# Altium footprint library Miscellaneous footprints.PcbLib: 84 footprints (part 2 of 6)
Each footprint in its own frame and in the unit in brackets; x right, y up, seen from the top. Pads: shape width x height; smd on the part's side, far side on the other; paste and mask are expansions set on the pad; w line width, h text height; cw(c..) or ccw(c..) is an arc to the next point about the centre after c.
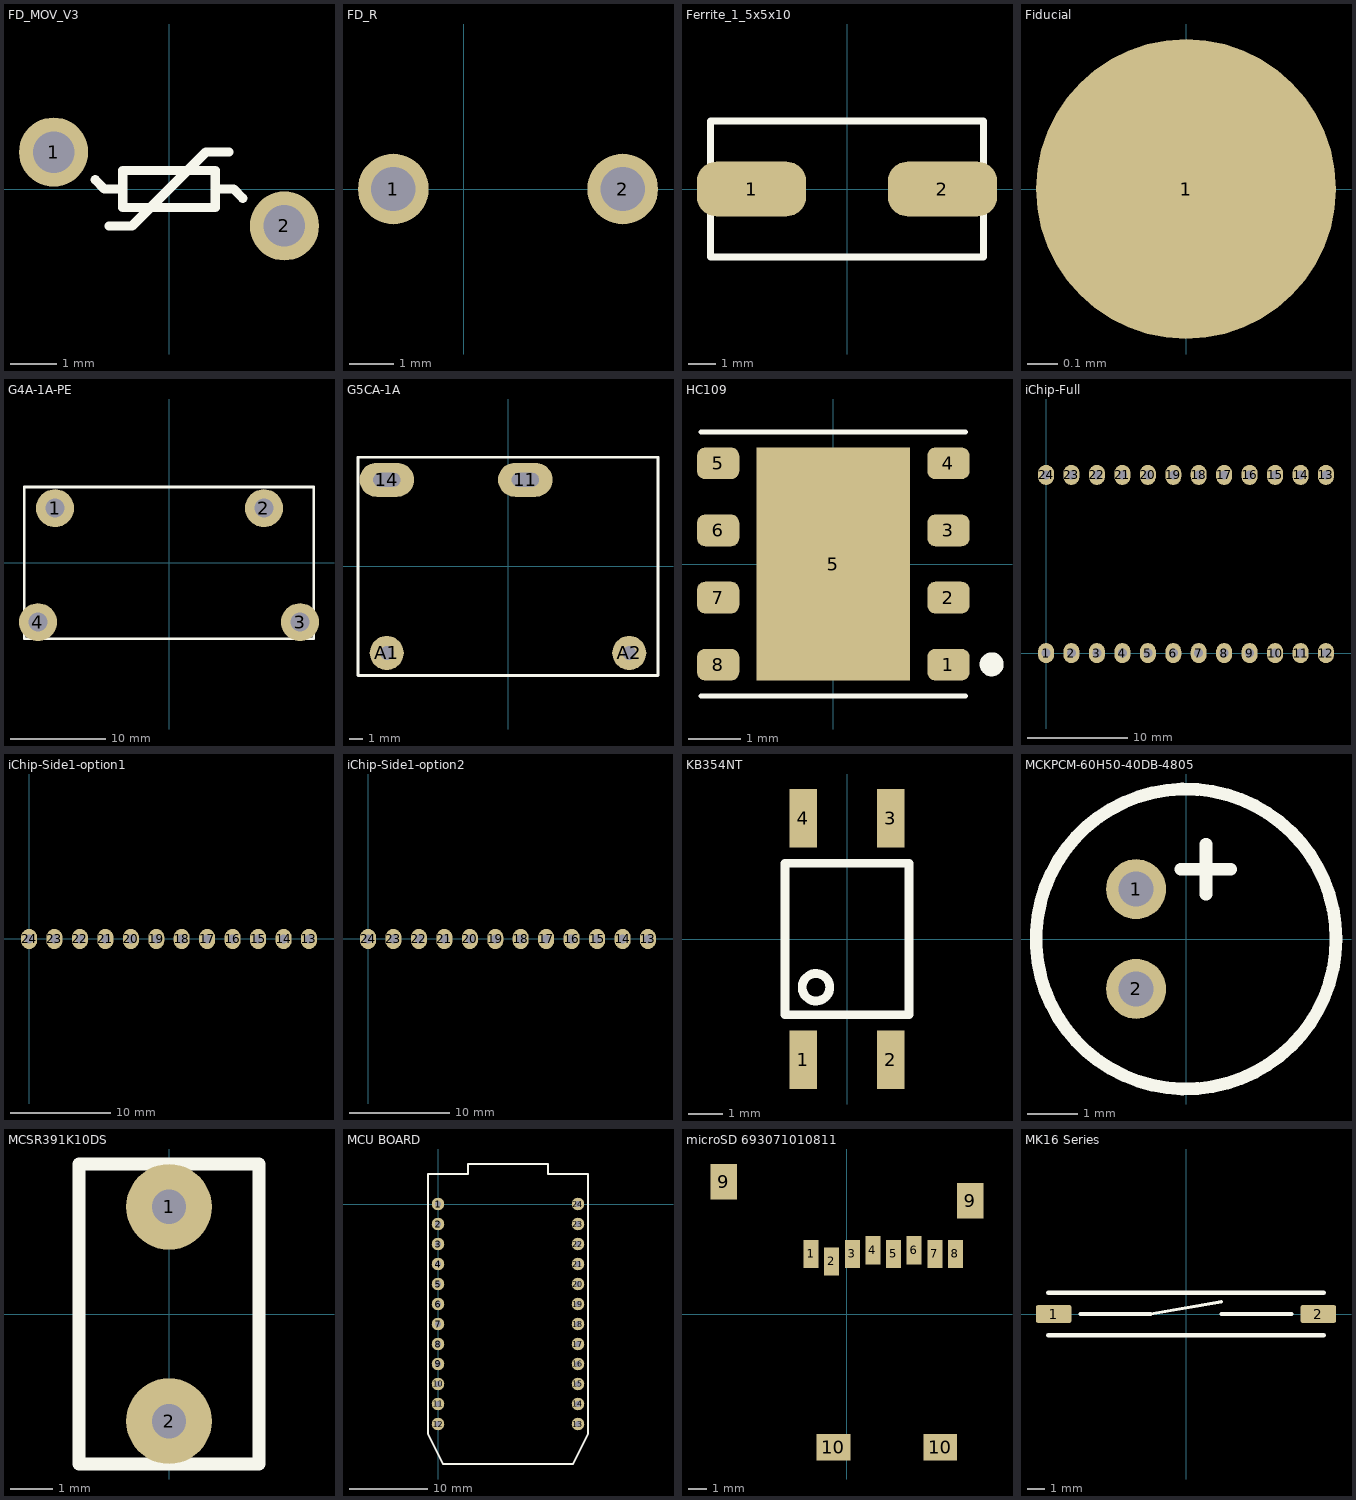
[diagram p1: the footprints below, top view; thin cyan lines are the x and y axes]

## FD_MOV_V3 [mm]
pads (2):
  round 1.5 hole 0.9: 1(-2.5,0.8) 2(2.5,-0.8)
Top Overlay:
  lines w0.2: -1.6,0.2 -1.4,0 -1,0 ; -1.3,-0.8 -0.8,-0.8 0,0 0.8,0.8 1.3,0.8 ; 1,0 1.4,0 1.6,-0.2 ; -1,0 -1,-0.4 1,-0.4 1,0.4 -1,0.4 -1,0
3D body: height 12, standoff 0, extent -4.499,-1.791 4.498,1.791

## FD_R [mm] "FD_R"
pads (2):
  round 1.6 hole 1: 1(-1.6,0) 2(3.6,0)
3D body: height 6, standoff 0, extent -3.6,-0.4 4,18.705

## Ferrite_1_5x5x10 [mm] "Ferrite_1_5x5x10"
height 5
pads (2):
  rrect70% 4x2 smd: 1(-3.5,0) 2(3.5,0)
Top Overlay:
  lines w0.254: -5,-2.5 5,-2.5 5,2.5 -5,2.5 -5,-2.5
3D body: height 5, standoff 0, extent -5,-2.5 5,2.5

## Fiducial [mm] "Fiducial, 1mm metal, 2mm solder mask"
pads (1):
  round 1 smd paste-1 mask+0.5: 1(0,0)

## G4A-1A-PE [mm] "20A relay"
pads (4):
  round 4 hole 2: 1(-12,5.75) 2(10,5.75) 3(13.8,-6.25) 4(-13.8,-6.25)
Top Overlay:
  lines w0.3: -15.25,-8 0,-8 15.25,-8 15.25,8 -15.25,8 -15.25,-8
3D body: height 26.8, standoff 0, extent -15.249,-7.999 15.249,7.999

## G5CA-1A [mm] "relay"
pads (4):
  oval 4x2.5 hole 1 slot 2 at 0 deg: 11(1.27,6.35) 14(-8.89,6.35)
  round 2.5 hole 1: A1(-8.89,-6.35) A2(8.89,-6.35)
Top Overlay:
  lines w0.2: -11,-8 0,-8 11,-8 11,0 11,8 0,8 -11,8 -11,0 -11,-8

## HC109 [mm] "HC109"
height 2
pads (9):
  rrect50% 0.8x0.6 smd: 1(2.18,-1.905) 2(2.18,-0.635) 3(2.18,0.635) 4(2.18,1.905) 5(-2.18,1.905) 6(-2.18,0.635) 7(-2.18,-0.635) 8(-2.18,-1.905)
  rect 2.9x4.41 smd: 5(0,0)
Top Overlay:
  circle w0.254: c3,-1.9 r0.1
  lines w0.1: -2.5,-2.5 2.5,-2.5 ; -2.5,2.5 2.5,2.5

## iChip-Full [mm]
pads (24):
  oval 1.6x2 hole 0.9: 1(0,0) 2(2.54,0) 3(5.08,0) 4(7.62,0) 5(10.16,0) 6(12.7,0) 7(15.24,0) 8(17.78,0) 9(20.32,0) 10(22.86,0) 11(25.4,0) 12(27.94,0) 13(27.94,17.78) 14(25.4,17.78) 15(22.86,17.78) 16(20.32,17.78) 17(17.78,17.78) 18(15.24,17.78) 19(12.7,17.78) 20(10.16,17.78) 21(7.62,17.78) 22(5.08,17.78) 23(2.54,17.78) 24(0,17.78)
3D body: height 5.28, standoff 0.95, extent -18.325,-2.1 32.925,19.9

## iChip-Side1-option1 [mm]
pads (12):
  oval 1.6x2 hole 0.9: 13(27.94,0) 14(25.4,0) 15(22.86,0) 16(20.32,0) 17(17.78,0) 18(15.24,0) 19(12.7,0) 20(10.16,0) 21(7.62,0) 22(5.08,0) 23(2.54,0) 24(0,0)
3D body: height 24.7, standoff 2.7, extent -18.35,1.54 32.9,5.86

## iChip-Side1-option2 [mm]
pads (12):
  oval 1.6x2 hole 0.9: 13(27.94,0) 14(25.4,0) 15(22.86,0) 16(20.32,0) 17(17.78,0) 18(15.24,0) 19(12.7,0) 20(10.16,0) 21(7.62,0) 22(5.08,0) 23(2.54,0) 24(0,0)
3D body: height 24.7, standoff 2.7, extent -18.35,-5.86 32.9,-1.54

## KB354NT [mm] "KB354NT"
height 2.8
pads (4):
  rect 0.8x1.7 smd: 1(-1.27,-3.5) 2(1.27,-3.5) 3(1.27,3.5) 4(-1.27,3.5)
Top Overlay:
  circle w0.254: c-0.9,-1.4 r0.4
  lines w0.254: -1.8,-2.2 1.8,-2.2 1.8,2.2 -1.8,2.2 -1.8,-2.2
3D body: height 2.62, standoff 0.02, extent -2.2,-3.5 2.2,3.5

## MCKPCM-60H50-40DB-4805 [mm] "MCKPCM-60H50-40DB-4805"
height 4.8
pads (2):
  round 1.2 hole 0.7: 1(-1,1) 2(-1,-1)
Top Overlay:
  circle w0.254: c0,0 r3.007
  lines w0.254: -0.1,1.4 0.4,1.4 0.9,1.4 ; 0.4,0.9 0.4,1.9
3D body: height 2.7, standoff -1.7, extent -3,-3 3,3

## MCSR391K10DS [mm] "MCSR391K10DS"
pads (2):
  round 2 hole 0.8: 1(0,2.5) 2(0,-2.5)
Top Overlay:
  lines w0.3: -2.1,-3.5 0,-3.5 2.1,-3.5 2.1,0 2.1,3.5 0,3.5 -2.1,3.5 -2.1,0 -2.1,-3.5
3D body: height 10, standoff 0, extent -2.099,-3.499 2.099,3.499

## MCU BOARD [mm]
pads (24):
  round 1.6 hole 0.8: 1(0,0) 2(0,-2.54) 3(0,-5.08) 4(0,-7.62) 5(0,-10.16) 6(0,-12.7) 7(0,-15.24) 8(0,-17.78) 9(0,-20.32) 10(0,-22.86) 11(0,-25.4) 12(0,-27.94) 13(17.78,-27.94) 14(17.78,-25.4) 15(17.78,-22.86) 16(17.78,-20.32) 17(17.78,-17.78) 18(17.78,-15.24) 19(17.78,-12.7) 20(17.78,-10.16) 21(17.78,-7.62) 22(17.78,-5.08) 23(17.78,-2.54) 24(17.78,0)
Top Overlay:
  lines w0.3: -1.27,-29.21 0.635,-33.02 17.145,-33.02 19.05,-29.21 19.05,1.27 19.05,3.81 13.97,3.81 13.97,5.08 8.89,5.08 3.81,5.08 3.81,3.81 -1.27,3.81 -1.27,1.27 -1.27,-29.21

## microSD 693071010811 [mm] "microSD holder push-push 693071010811 from Wurth Elektronik"
pads (12):
  rect 0.8x1.5 smd: 1(-1.915,3.225) 2(-0.815,2.825) 3(0.285,3.225) 4(1.385,3.425) 5(2.485,3.225) 6(3.585,3.425) 7(4.685,3.225) 8(5.785,3.225)
  rect 1.4x1.9 smd: 9(-6.575,7.075) 9(6.575,6.075)
  rect 1.8x1.4 smd: 10(-0.725,-7.075) 10(4.975,-7.075)
3D body: height 1.83, standoff -0.07, extent -6.975,-7.475 7.025,7.725

## MK16 Series [mm] "MK16 Series"
height 2.3
pads (2):
  rrect20% 2x1 smd: 1(-7.5,0) 2(7.5,0)
Top Overlay:
  lines w0.2: -6,0 -2,0 2,0.7 ; 2,0 6,0
  lines w0.254: -7.8,-1.2 7.8,-1.2 ; -7.8,1.2 7.8,1.2
3D body: height 2.3, standoff 0, extent -7.8,-1.15 7.8,1.15